# Altium footprint library 总库.PcbLib: 264 footprints (part 8 of 17)
Each footprint in its own frame and in the unit in brackets; x right, y up, seen from the top. Pads: shape width x height; smd on the part's side, far side on the other; paste and mask are expansions set on the pad; w line width, h text height; cw(c..) or ccw(c..) is an arc to the next point about the centre after c.
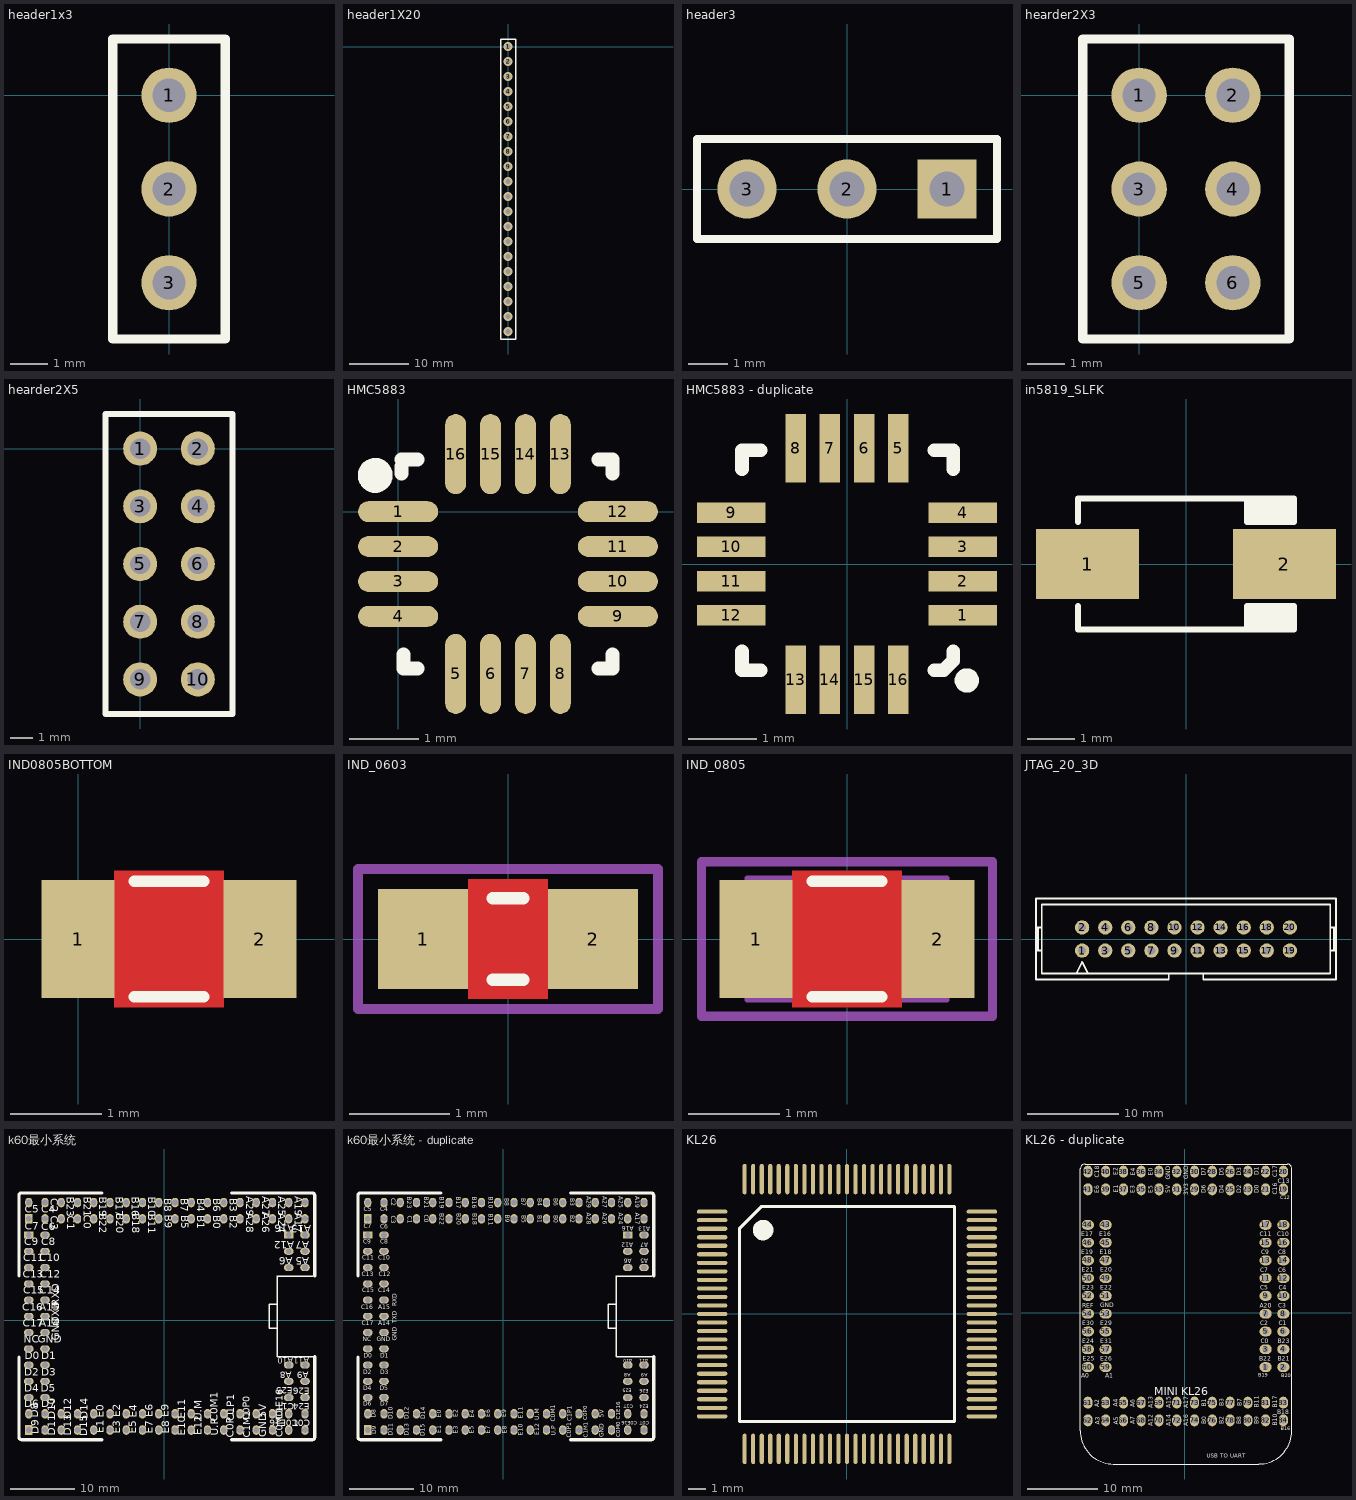
[diagram p7: the footprints below, top view; thin cyan lines are the x and y axes]

## header1x3 [mm]
pads (3):
  round 1.5 hole 0.9: 1(0,0) 2(0,-2.54) 3(0,-5.08)
Top Overlay:
  lines w0.254: -1.524,-6.604 -1.524,1.524 1.524,1.524 1.524,-6.604 -1.524,-6.604
3D body: height 8.54, standoff -3, extent -1.27,-6.35 1.22,1.27

## header1X20 [mm]
pads (20):
  round 1.5 hole 0.9: 1(0,0) 2(0,-2.54) 3(0,-5.08) 4(0,-7.62) 5(0,-10.16) 6(0,-12.7) 7(0,-15.24) 8(0,-17.78) 9(0,-20.32) 10(0,-22.86) 11(0,-25.4) 12(0,-27.94) 13(0,-30.48) 14(0,-33.02) 15(0,-35.56) 16(0,-38.1) 17(0,-40.64) 18(0,-43.18) 19(0,-45.72) 20(0,-48.26)
Top Overlay:
  lines w0.254: -1.27,-49.53 -1.27,1.27 1.27,1.27 1.27,-49.53 -1.27,-49.53
3D body: height 9.3, standoff -2.85, extent -1.27,-49.53 1.27,1.27

## header3 [mm]
pads (3):
  rect 1.5x1.5 hole 0.9: 1(2.54,0)
  round 1.5 hole 0.9: 2(0,0) 3(-2.54,0)
Top Overlay:
  lines w0.2: -3.81,-1.27 3.81,-1.27 3.81,1.27 -3.81,1.27 -3.81,-1.27

## hearder2X3 [mm]
pads (6):
  round 1.5 hole 0.9: 1(0,0) 2(2.54,0) 3(0,-2.54) 4(2.54,-2.54) 5(0,-5.08) 6(2.54,-5.08)
Top Overlay:
  lines w0.254: -1.524,-6.604 4.064,-6.604 4.064,1.524 -1.524,1.524 -1.524,-6.604
3D body: height 8.5, standoff -3, extent -1.255,-6.325 3.785,1.295

## hearder2X5 [mm]
pads (10):
  round 1.5 hole 0.9: 1(0,0) 2(2.54,0) 3(0,-2.54) 4(2.54,-2.54) 5(0,-5.08) 6(2.54,-5.08) 7(0,-7.62) 8(2.54,-7.62) 9(0,-10.16) 10(2.54,-10.16)
Top Overlay:
  lines w0.254: -1.524,-11.684 -1.524,1.524 4.064,1.524 4.064,-11.684 -1.524,-11.684

## HMC5883 [mm] "LCC, 16-Pins, Body 3.0x3.0mm (max), Pitch 0.50mm, IPC Medium Density"
height 2.54
pads (16):
  oval 1.15x0.3 smd: 1(0,0) 2(0,-0.5) 3(0,-1) 4(0,-1.5) 9(3.15,-1.5) 10(3.15,-1) 11(3.15,-0.5) 12(3.15,0)
  oval 0.3x1.15 smd: 5(0.825,-2.325) 6(1.325,-2.325) 7(1.825,-2.325) 8(2.325,-2.325) 13(2.325,0.825) 14(1.825,0.825) 15(1.325,0.825) 16(0.825,0.825)
Top Overlay:
  circle w0.25: c-0.328,0.52 r0.125
  lines w0.2: 0.051,0.547 0.051,0.647 ; 0.051,0.75 0.275,0.75 ; 0.075,-2.05 0.075,-2.25 0.275,-2.25 ; 2.875,-2.25 3.075,-2.25 3.075,-2.05 ; 2.875,0.75 3.075,0.75 3.075,0.55

## HMC5883 - duplicate [mm]
pads (16):
  rect 1x0.3 smd: 1(1.691,-0.75) 2(1.691,-0.25) 3(1.691,0.25) 4(1.691,0.75) 9(-1.691,0.75) 10(-1.691,0.25) 11(-1.691,-0.25) 12(-1.691,-0.75)
  rect 0.3x1 smd: 5(0.75,1.691) 6(0.25,1.691) 7(-0.25,1.691) 8(-0.75,1.691) 13(-0.75,-1.691) 14(-0.25,-1.691) 15(0.25,-1.691) 16(0.75,-1.691)
Top Overlay:
  circle w0.254: c1.75,-1.7 r0.05
  lines w0.2: -1.534,-1.275 -1.534,-1.55 -1.259,-1.55 ; -1.534,1.386 -1.534,1.661 -1.259,1.661 ; 1.275,-1.55 1.413,-1.55 1.55,-1.413 1.55,-1.275 ; 1.275,1.661 1.55,1.661 1.55,1.386
3D body: height 0.76, standoff 0, extent -1.526,-1.501 1.522,1.674

## in5819_SLFK [mm] "JEDEC DO214 variation AC. SMA"
height 2.5
pads (2):
  rect 2.2x1.5 smd: 1(-2.1,0) 2(2.1,0)
Top Overlay:
  rectangle: 1.3,0.9 2.3,1.4
  rectangle: 1.3,-1.4 2.3,-0.9
  lines w0.127: -2.3,-0.9 -2.3,-1.4 2.3,-1.4 2.3,-0.9 1.3,-0.9 1.3,-1.4 ; -2.3,0.9 -2.3,1.4 2.3,1.4 2.3,0.9 1.3,0.9 ; 1.3,0.911 1.3,1.4
3D body: height 2.42, standoff 0.02, extent -2.6,-1.3 2.6,1.3

## IND0805BOTTOM [mm]
pads (2):
  rect 0.8x1.3 smd: 1(0,0) 2(2,0)
Top Layer:
  pour cut-out: 0.4,0.75 1.6,0.75 1.6,-0.75 0.4,-0.75
Top Overlay:
  lines w0.127: 0.619,-0.635 1.381,-0.635 ; 0.619,0.635 1.381,0.635

## IND_0603 [mm] "Chip bead, Body 1.6x0.8mm, 0603, IPC Medium Density"
height 0.8
pads (2):
  rect 0.9x1 smd: 1(-0.85,0) 2(0.85,0)
Top Layer:
  pour cut-out: -0.4,0.6 0.4,0.6 0.4,-0.6 -0.4,-0.6
Top Overlay:
  lines w0.127: -0.152,-0.406 0.152,-0.406 ; -0.152,0.406 0.152,0.406
Mechanical 13:
  lines w0.05: -0.875,-0.475 -0.875,0.475 -0.475,0.475 -0.475,-0.475 -0.875,-0.475 ; -0.475,-0.474 0.475,-0.474 -0.475,-0.474 ; -0.475,0.474 0.475,0.474 -0.475,0.474 ; 0.475,-0.475 0.875,-0.475 0.875,0.475 0.475,0.475 0.475,-0.475
Mechanical 14:
  lines w0.1: -1.5,-0.7 1.5,-0.7 1.5,0.7 -1.5,0.7 -1.5,-0.7
3D body: height 0.79, standoff -0.01, extent -0.8,-0.4 0.8,0.4

## IND_0805 [mm] "Ferrite Bead Chip, Body 2.0x1.2mm, 0805, IPC Medium Density"
height 0.9
pads (2):
  rect 0.8x1.3 smd: 1(-1,0) 2(1,0)
Top Layer:
  pour cut-out: -0.6,0.75 0.6,0.75 0.6,-0.75 -0.6,-0.75
Top Overlay:
  lines w0.127: -0.381,-0.635 0.381,-0.635 ; -0.381,0.635 0.381,0.635
Mechanical 13:
  lines w0.05: 0.6,-0.674 -0.6,-0.674 ; -0.6,-0.675 -0.6,0.675 -1.1,0.675 -1.1,-0.675 -0.6,-0.675 ; -0.6,-0.674 0.6,-0.674 ; 0.6,-0.675 0.6,0.675 ; 0.6,-0.675 1.1,-0.675 1.1,0.675 0.6,0.675 ; 0.6,0.674 -0.6,0.674 0.6,0.674
Mechanical 14:
  lines w0.1: -1.6,-0.85 1.6,-0.85 1.6,0.85 -1.6,0.85 -1.6,-0.85
3D body: height 0.9, standoff 0, extent -1,-0.625 1,0.625

## JTAG_20_3D [mil]
pads (20):
  round 62 hole 35: 1(-450,-50) 2(-450,50) 3(-350,-50) 4(-350,50) 5(-250,-50) 6(-250,50) 7(-150,-50) 8(-150,50) 9(-50,-50) 10(-50,50) 11(50,-50) 12(50,50) 13(150,-50) 14(150,50) 15(250,-50) 16(250,50) 17(350,-50) 18(350,50) 19(450,-50) 20(450,50)
Top Overlay:
  lines w8: -650,-50 -625,-50 ; -650,50 -625,50 ; -641.67,-50 -641.67,50 ; -475,-150 -450,-100 -425,-150 ; -339.57,-175 -75,-175 -75,-150 ; -325,-175 -650,-175 -650,175 650,175 650,-175 325,-175 75,-175 75,-150 ; 625,-50 650,-50 ; 625,50 650,50 ; 641.67,-50 641.67,50 ; -75,-150 75,-150 ; -75,-150 -625,-150 -625,150 625,150 625,-150 75,-150
3D body: height 363.79, standoff -85.03, extent -643.7,-63 643.7,435.02

## k60最小系统 [mm]
pads (106):
  rect 1.5x1.1 hole 0.9: 1(-21.158,13.284) 80(19.482,13.284)
  oval 1.5x1.1 hole 0.9: 2(-18.618,13.284) 3(-21.158,10.744) 4(-18.618,10.744) 5(-21.158,8.204) 6(-18.618,8.204) 7(-21.158,5.664) 8(-18.618,5.664) 9(-21.158,3.124) 10(-18.618,3.124) 11(-21.158,0.584) 12(-18.618,0.584) 13(-21.158,-1.956) 14(-18.618,-1.956) 15(-21.158,-4.496) 16(-18.618,-4.496) 17(-21.158,-7.036) 18(-18.618,-7.036) 19(-21.158,-9.576) 20(-18.618,-9.576) 21(-21.158,-12.116) 22(-18.618,-12.116) 59(22.022,-12.116) 60(19.482,-12.116) 61(22.022,-9.576) 62(19.482,-9.576) 63(22.022,-7.036) 64(19.482,-7.036) 75(22.022,8.204) 76(19.482,8.204) 77(22.022,10.744) 78(19.482,10.744) 79(22.022,13.284)
  rect 1.1x1.5 hole 0.9: 23(-21.158,-17.196) 116(-21.158,15.824)
  oval 1.1x1.5 hole 0.9: 24(-21.158,-14.656) 25(-18.618,-17.196) 26(-18.618,-14.656) 27(-16.078,-17.196) 28(-16.078,-14.656) 29(-13.538,-17.196) 30(-13.538,-14.656) 31(-10.998,-17.196) 32(-10.998,-14.656) 33(-8.458,-17.196) 34(-8.458,-14.656) 35(-5.918,-17.196) 36(-5.918,-14.656) 37(-3.378,-17.196) 38(-3.378,-14.656) 39(-0.838,-17.196) 40(-0.838,-14.656) 41(1.702,-17.196) 42(1.702,-14.656) 43(4.242,-17.196) 44(4.242,-14.656) 45(6.782,-17.196) 46(6.782,-14.656) 47(9.322,-17.196) 48(9.322,-14.656) 49(11.862,-17.196) 50(11.862,-14.656) 51(14.402,-17.196) 52(14.402,-14.656) 53(16.942,-17.196) 54(16.942,-14.656) 55(19.482,-17.196) 56(19.482,-14.656) 57(22.022,-17.196) 58(22.022,-14.656) 81(22.022,18.364) 82(22.022,15.824) 83(19.482,18.364) 84(19.482,15.824) 85(16.942,18.364) 86(16.942,15.824) 87(14.402,18.364) 88(14.402,15.824) 89(11.862,18.364) 90(11.862,15.824) 91(9.322,18.364) 92(9.322,15.824) 93(6.782,18.364) 94(6.782,15.824) 95(4.242,18.364) 96(4.242,15.824) 97(1.702,18.364) 98(1.702,15.824) 99(-0.838,18.364) 100(-0.838,15.824) 101(-3.378,18.364) 102(-3.378,15.824) 103(-5.918,18.364) 104(-5.918,15.824) 105(-8.458,18.364) 106(-8.458,15.824) 107(-10.998,18.364) 108(-10.998,15.824) 109(-13.538,18.364) 110(-13.538,15.824) 111(-16.078,18.364) 112(-16.078,15.824) 113(-18.618,18.364) 114(-18.618,15.824) 115(-21.158,18.364)
Top Overlay:
  lines w0.203: 17.704,-5.766 17.704,6.934 ; 17.704,-5.715 23.216,-5.715 ; 17.704,-1.295 16.416,-1.295 16.416,2.438 17.704,2.438 ; 17.704,6.858 23.216,6.858
  lines w0.508: -22.682,-5.766 -22.682,-18.313 ccw(c-22.301,-18.313) -22.301,-18.694 -9.728,-18.694 ; -22.682,6.934 -22.682,19.482 cw(c-22.301,19.482) -22.301,19.863 -9.728,19.863 ; 10.592,-18.694 23.165,-18.694 ccw(c23.165,-18.313) 23.546,-18.313 23.546,-5.715 ; 10.592,19.863 23.165,19.863 cw(c23.165,19.482) 23.546,19.482 23.546,6.934
  text "C3" at -17.704,16.332 h1.2
  text "C2" at -17.704,19.05 h1.2
  text "C1" at -15.113,16.332 h1.2
  text "B23" at -15.189,19.253 h1.2
  text "C0" at -12.573,16.459 h1.2
  text "B21" at -12.598,19.279 h1.2
  text "B19" at -10.109,19.279 h1.2
  text "B22" at -10.109,16.662 h1.2
  text "B20" at -7.518,16.662 h1.2
  text "B17" at -7.544,19.279 h1.2
  text "B18" at -5.004,16.662 h1.2
  text "B16" at -5.029,19.279 h1.2
  text "B11" at -2.464,16.637 h1.2
  text "B10" at -2.464,19.253 h1.2
  text "B9" at 0.076,16.434 h1.2
  text "B8" at 0.025,19.025 h1.2
  text "B5" at 2.642,16.358 h1.2
  text "B7" at 2.616,19.05 h1.2
  text "B4" at 5.156,19.025 h1.2
  text "B1" at 5.207,16.358 h1.2
  text "B0" at 7.696,16.383 h1.2
  text "B6" at 7.696,18.999 h1.2
  text "B2" at 10.262,16.408 h1.2
  text "B3" at 10.287,19.05 h1.2
  text "A28" at 12.827,16.739 h1.2
  text "A29" at 12.802,19.329 h1.2
  text "A26" at 15.367,16.764 h1.2
  text "A27" at 15.342,19.38 h1.2
  text "A24" at 17.882,16.789 h1.2
  text "A25" at 17.856,19.355 h1.2
  text "A17" at 20.447,16.789 h1.2
  text "A19" at 20.396,19.38 h1.2
  text "A16" at 20.422,14.859 h1.2
  text "A13" at 23.012,14.834 h1.2
  text "A12" at 20.371,12.344 h1.2
  text "A7" at 22.682,12.319 h1.2
  text "A6" at 20.117,9.804 h1.2
  text "A5" at 22.657,9.804 h1.2
  text "A10" at 20.168,-5.867 h0.9
  text "A11" at 22.708,-5.867 h0.9
  text "A8" at 19.964,-8.052 h1
  text "A9" at 22.631,-8.052 h1
  text "E25" at 20.117,-10.541 h1
  text "E26" at 22.758,-10.592 h1
  text "E24" at 22.784,-13.005 h1
  text "C1T" at 20.32,-13.005 h1
  text "C0T" at 22.86,-15.621 h1
  text "C0E16" at 20.955,-15.596 h1
  text "C1E16" at 18.567,-15.596 h1.1
  text "C0M0" at 18.567,-18.339 h1.1
  text "5V" at 15.977,-15.265 h1.2
  text "GND" at 15.951,-18.339 h1.2
  text "C0P0" at 13.386,-15.672 h1.1
  text "C1M1" at 13.437,-18.39 h1.1
  text "C1P1" at 10.973,-15.85 h1.2
  text "C0P1" at 10.922,-18.415 h1.2
  text "C0M1" at 8.407,-15.875 h1.2
  text "U.P" at 8.433,-18.059 h1.2
  text "U.M" at 5.867,-15.672 h1.2
  text "E12" at 5.918,-18.034 h1.2
  text "E11" at 3.302,-15.443 h1.2
  text "E10" at 3.302,-18.059 h1.2
  text "E9" at 0.762,-15.164 h1.2
  text "E8" at 0.787,-17.78 h1.2
  text "E7" at -1.753,-17.805 h1.2
  text "E6" at -1.803,-15.189 h1.2
  text "E4" at -4.293,-15.24 h1.2
  text "E5" at -4.318,-17.805 h1.2
  text "E2" at -6.858,-15.189 h1.2
  text "E3" at -6.833,-17.755 h1.2
  text "E0" at -9.398,-15.24 h1.2
  text "E1" at -9.423,-17.729 h1.2
  text "D14" at -11.938,-15.519 h1.2
  text "D15" at -11.989,-18.136 h1.2
  text "D12" at -14.478,-15.519 h1.2
  text "D13" at -14.503,-18.11 h1.2
  text "D10" at -17.018,-15.545 h1.2
  text "D11" at -17.043,-18.085 h1.2
  text "D8" at -19.634,-15.265 h1.2
  text "D9" at -19.583,-17.831 h1.2
  text "D7" at -19.228,-13.614 h1.2
  text "D6" at -21.844,-13.614 h1.2
  text "D5" at -19.253,-11.201 h1.2
  text "D4" at -21.844,-11.201 h1.2
  text "D3" at -19.202,-8.687 h1.2
  text "D2" at -21.844,-8.687 h1.2
  text "D1" at -19.177,-6.121 h1.2
  text "D0" at -21.819,-6.096 h1.2
  text "GND" at -19.736,-3.556 h1.2
  text "NC" at -21.92,-3.581 h1.2
  text "A14" at -19.533,-1.067 h1.2
  text "C17" at -22.098,-1.041 h1.2
  text "A15" at -19.533,1.473 h1.2
  text "C16" at -22.149,1.473 h1.2
  text "C14" at -19.507,4.115 h1.2
  text "C15" at -22.022,4.089 h1.2
  text "C12" at -19.431,6.579 h1.2
  text "C13" at -22.073,6.604 h1.2
  text "C10" at -19.482,9.169 h1.2
  text "C11" at -22.022,9.195 h1.2
  text "C8" at -19.228,11.659 h1.2
  text "C9" at -21.869,11.659 h1.2
  text "C6" at -19.228,14.072 h1.2
  text "C7" at -21.793,14.122 h1.2
  text "C4" at -19.202,16.739 h1.2
  text "C5" at -21.768,16.764 h1.2
  text "GND" at -16.367,-3.2 h1.2
  text "TXD" at -16.383,-0.508 h1.2
  text "RXD" at -16.383,2.184 h1.2
Bottom Overlay:
  lines w0.2: -22.428,-13.386 -22.428,-18.466 23.292,-18.466 23.292,-13.386 ; -22.428,-13.386 23.292,-13.386 ; -22.428,-13.386 -22.428,14.554 ; -22.428,-13.386 -17.348,-13.386 -17.348,14.554 -22.428,14.554 ; -22.428,14.554 -22.428,19.634 23.292,19.634 23.292,14.554 ; -22.428,14.554 23.292,14.554 ; 23.292,-13.386 23.292,14.554 ; 23.292,-13.386 18.212,-13.386 18.212,14.554 23.292,14.554
  lines w0.203: 23.216,-3.175 23.216,4.318
3D body: height 10.62, standoff -0.92, extent -22.378,-18.466 -19.888,-13.386
3D body: height 10.62, standoff -0.92, extent -19.838,-18.466 -17.348,-13.386
3D body: height 10.62, standoff -0.92, extent -17.298,-18.466 -14.808,-13.386
3D body: height 10.62, standoff -0.92, extent -14.758,-18.466 -12.268,-13.386
3D body: height 10.62, standoff -0.92, extent -12.218,-18.466 -9.728,-13.386
3D body: height 10.62, standoff -0.92, extent -9.678,-18.466 -7.188,-13.386
3D body: height 10.62, standoff -0.92, extent 5.562,-18.466 8.052,-13.386
3D body: height 10.62, standoff -0.92, extent 3.022,-18.466 5.512,-13.386
3D body: height 10.62, standoff -0.92, extent 0.482,-18.466 2.972,-13.386
3D body: height 10.62, standoff -0.92, extent -2.058,-18.466 0.432,-13.386
3D body: height 10.62, standoff -0.92, extent -4.598,-18.466 -2.108,-13.386
3D body: height 10.62, standoff -0.92, extent -7.138,-18.466 -4.648,-13.386
3D body: height 10.62, standoff -0.92, extent 20.802,-18.466 23.292,-13.386
3D body: height 10.62, standoff -0.92, extent 18.262,-18.466 20.752,-13.386
3D body: height 10.62, standoff -0.92, extent 15.722,-18.466 18.212,-13.386
3D body: height 10.62, standoff -0.92, extent 13.182,-18.466 15.672,-13.386
3D body: height 10.62, standoff -0.92, extent 10.642,-18.466 13.132,-13.386
3D body: height 10.62, standoff -0.92, extent 8.102,-18.466 10.592,-13.386
3D body: height 10.62, standoff -0.92, extent 18.212,12.014 23.292,14.504
3D body: height 10.62, standoff -0.92, extent 18.212,9.474 23.292,11.964
3D body: height 10.62, standoff -0.92, extent 18.212,6.934 23.292,9.424
3D body: height 10.62, standoff -0.92, extent 18.212,-13.386 23.292,-10.896
3D body: height 10.62, standoff -0.92, extent 18.212,-10.846 23.292,-8.356
3D body: height 10.62, standoff -0.92, extent 18.212,-8.306 23.292,-5.816
3D body: height 16.16, standoff 4.62, extent 18.212,-5.766 23.292,-3.276
3D body: height 16.16, standoff 4.62, extent 18.212,-3.226 23.292,-0.736
3D body: height 16.16, standoff 4.62, extent 18.212,-0.686 23.292,1.804
3D body: height 16.16, standoff 4.62, extent 18.212,1.854 23.292,4.344
3D body: height 16.16, standoff 4.62, extent 18.212,4.394 23.292,6.884
3D body: height 10.62, standoff -0.92, extent -22.428,-5.766 -17.348,-3.276
3D body: height 10.62, standoff -0.92, extent -22.428,-8.306 -17.348,-5.816
3D body: height 10.62, standoff -0.92, extent -22.428,-10.846 -17.348,-8.356
3D body: height 10.62, standoff -0.92, extent -22.428,-13.386 -17.348,-10.896
3D body: height 10.62, standoff -0.92, extent -22.428,12.014 -17.348,14.504
3D body: height 10.62, standoff -0.92, extent -22.428,9.474 -17.348,11.964
3D body: height 10.62, standoff -0.92, extent -22.428,6.934 -17.348,9.424
3D body: height 10.62, standoff -0.92, extent -22.428,4.394 -17.348,6.884
3D body: height 10.62, standoff -0.92, extent -22.428,-3.226 -19.938,4.394
3D body: height 16.16, standoff 4.62, extent -19.888,-3.226 -17.398,4.394
3D body: height 10.62, standoff -0.92, extent -22.378,14.554 -19.888,19.634
3D body: height 10.62, standoff -0.92, extent -19.838,14.554 -17.348,19.634
3D body: height 10.62, standoff -0.92, extent -17.298,14.554 -14.808,19.634
3D body: height 10.62, standoff -0.92, extent -14.758,14.554 -12.268,19.634
3D body: height 10.62, standoff -0.92, extent -12.218,14.554 -9.728,19.634
3D body: height 10.62, standoff -0.92, extent -9.678,14.554 -7.188,19.634
3D body: height 10.62, standoff -0.92, extent 5.562,14.554 8.052,19.634
3D body: height 10.62, standoff -0.92, extent 3.022,14.554 5.512,19.634
3D body: height 10.62, standoff -0.92, extent 0.482,14.554 2.972,19.634
3D body: height 10.62, standoff -0.92, extent -2.058,14.554 0.432,19.634
3D body: height 10.62, standoff -0.92, extent -4.598,14.554 -2.108,19.634
3D body: height 10.62, standoff -0.92, extent -7.138,14.554 -4.648,19.634
3D body: height 10.62, standoff -0.92, extent 20.802,14.554 23.292,19.634
3D body: height 10.62, standoff -0.92, extent 18.262,14.554 20.752,19.634
3D body: height 10.62, standoff -0.92, extent 15.722,14.554 18.212,19.634
3D body: height 10.62, standoff -0.92, extent 13.182,14.554 15.672,19.634
3D body: height 10.62, standoff -0.92, extent 10.642,14.554 13.132,19.634
3D body: height 10.62, standoff -0.92, extent 8.102,14.554 10.592,19.634

## k60最小系统 - duplicate [mm]
pads (106):
  rect 1.5x1.1 hole 0.9: 1(-21.158,13.284) 80(19.482,13.284)
  oval 1.5x1.1 hole 0.9: 2(-18.618,13.284) 3(-21.158,10.744) 4(-18.618,10.744) 5(-21.158,8.204) 6(-18.618,8.204) 7(-21.158,5.664) 8(-18.618,5.664) 9(-21.158,3.124) 10(-18.618,3.124) 11(-21.158,0.584) 12(-18.618,0.584) 13(-21.158,-1.956) 14(-18.618,-1.956) 15(-21.158,-4.496) 16(-18.618,-4.496) 17(-21.158,-7.036) 18(-18.618,-7.036) 19(-21.158,-9.576) 20(-18.618,-9.576) 21(-21.158,-12.116) 22(-18.618,-12.116) 59(22.022,-12.116) 60(19.482,-12.116) 61(22.022,-9.576) 62(19.482,-9.576) 63(22.022,-7.036) 64(19.482,-7.036) 75(22.022,8.204) 76(19.482,8.204) 77(22.022,10.744) 78(19.482,10.744) 79(22.022,13.284)
  rect 1.1x1.5 hole 0.9: 23(-21.158,-17.196) 116(-21.158,15.824)
  oval 1.1x1.5 hole 0.9: 24(-21.158,-14.656) 25(-18.618,-17.196) 26(-18.618,-14.656) 27(-16.078,-17.196) 28(-16.078,-14.656) 29(-13.538,-17.196) 30(-13.538,-14.656) 31(-10.998,-17.196) 32(-10.998,-14.656) 33(-8.458,-17.196) 34(-8.458,-14.656) 35(-5.918,-17.196) 36(-5.918,-14.656) 37(-3.378,-17.196) 38(-3.378,-14.656) 39(-0.838,-17.196) 40(-0.838,-14.656) 41(1.702,-17.196) 42(1.702,-14.656) 43(4.242,-17.196) 44(4.242,-14.656) 45(6.782,-17.196) 46(6.782,-14.656) 47(9.322,-17.196) 48(9.322,-14.656) 49(11.862,-17.196) 50(11.862,-14.656) 51(14.402,-17.196) 52(14.402,-14.656) 53(16.942,-17.196) 54(16.942,-14.656) 55(19.482,-17.196) 56(19.482,-14.656) 57(22.022,-17.196) 58(22.022,-14.656) 81(22.022,18.364) 82(22.022,15.824) 83(19.482,18.364) 84(19.482,15.824) 85(16.942,18.364) 86(16.942,15.824) 87(14.402,18.364) 88(14.402,15.824) 89(11.862,18.364) 90(11.862,15.824) 91(9.322,18.364) 92(9.322,15.824) 93(6.782,18.364) 94(6.782,15.824) 95(4.242,18.364) 96(4.242,15.824) 97(1.702,18.364) 98(1.702,15.824) 99(-0.838,18.364) 100(-0.838,15.824) 101(-3.378,18.364) 102(-3.378,15.824) 103(-5.918,18.364) 104(-5.918,15.824) 105(-8.458,18.364) 106(-8.458,15.824) 107(-10.998,18.364) 108(-10.998,15.824) 109(-13.538,18.364) 110(-13.538,15.824) 111(-16.078,18.364) 112(-16.078,15.824) 113(-18.618,18.364) 114(-18.618,15.824) 115(-21.158,18.364)
Top Overlay:
  lines w0.203: 17.704,-5.766 17.704,6.934 ; 17.704,-5.715 23.216,-5.715 ; 17.704,-1.295 16.416,-1.295 16.416,2.438 17.704,2.438 ; 17.704,6.858 23.216,6.858
  lines w0.508: -22.682,-5.766 -22.682,-18.313 ccw(c-22.301,-18.313) -22.301,-18.694 -9.728,-18.694 ; -22.682,6.934 -22.682,19.482 cw(c-22.301,19.482) -22.301,19.863 -9.728,19.863 ; 10.592,-18.694 23.165,-18.694 ccw(c23.165,-18.313) 23.546,-18.313 23.546,-5.715 ; 10.592,19.863 23.165,19.863 cw(c23.165,19.482) 23.546,19.482 23.546,6.934
  text "C3" at -17.704,16.332 h1.2
  text "C2" at -17.704,19.05 h1.2
  text "C1" at -15.113,16.332 h1.2
  text "B23" at -15.189,19.253 h1.2
  text "C0" at -12.573,16.459 h1.2
  text "B21" at -12.598,19.279 h1.2
  text "B19" at -10.109,19.279 h1.2
  text "B22" at -10.109,16.662 h1.2
  text "B20" at -7.518,16.662 h1.2
  text "B17" at -7.544,19.279 h1.2
  text "B18" at -5.004,16.662 h1.2
  text "B16" at -5.029,19.279 h1.2
  text "B11" at -2.464,16.637 h1.2
  text "B10" at -2.464,19.253 h1.2
  text "B9" at 0.076,16.434 h1.2
  text "B8" at 0.025,19.025 h1.2
  text "B5" at 2.642,16.358 h1.2
  text "B7" at 2.616,19.05 h1.2
  text "B4" at 5.156,19.025 h1.2
  text "B1" at 5.207,16.358 h1.2
  text "B0" at 7.696,16.383 h1.2
  text "B6" at 7.696,18.999 h1.2
  text "B2" at 10.262,16.408 h1.2
  text "B3" at 10.287,19.05 h1.2
  text "A28" at 12.827,16.739 h1.2
  text "A29" at 12.802,19.329 h1.2
  text "A26" at 15.367,16.764 h1.2
  text "A27" at 15.342,19.38 h1.2
  text "A24" at 17.882,16.789 h1.2
  text "A25" at 17.856,19.355 h1.2
  text "A17" at 20.447,16.789 h1.2
  text "A19" at 20.396,19.38 h1.2
  text "A16" at 20.422,14.859 h1.2
  text "A13" at 23.012,14.834 h1.2
  text "A12" at 20.371,12.344 h1.2
  text "A7" at 22.682,12.319 h1.2
  text "A6" at 20.117,9.804 h1.2
  text "A5" at 22.657,9.804 h1.2
  text "A10" at 20.168,-5.867 h0.9
  text "A11" at 22.708,-5.867 h0.9
  text "A8" at 19.964,-8.052 h1
  text "A9" at 22.631,-8.052 h1
  text "E25" at 20.117,-10.541 h1
  text "E26" at 22.758,-10.592 h1
  text "E24" at 22.784,-13.005 h1
  text "C1T" at 20.32,-13.005 h1
  text "C0T" at 22.86,-15.621 h1
  text "C0E16" at 20.955,-15.596 h1
  text "C1E16" at 18.567,-15.596 h1.1
  text "C0M0" at 18.567,-18.339 h1.1
  text "5V" at 15.977,-15.265 h1.2
  text "GND" at 15.951,-18.339 h1.2
  text "C0P0" at 13.386,-15.672 h1.1
  text "C1M1" at 13.437,-18.39 h1.1
  text "C1P1" at 10.973,-15.85 h1.2
  text "C0P1" at 10.922,-18.415 h1.2
  text "C0M1" at 8.407,-15.875 h1.2
  text "U.P" at 8.433,-18.059 h1.2
  text "U.M" at 5.867,-15.672 h1.2
  text "E12" at 5.918,-18.034 h1.2
  text "E11" at 3.302,-15.443 h1.2
  text "E10" at 3.302,-18.059 h1.2
  text "E9" at 0.762,-15.164 h1.2
  text "E8" at 0.787,-17.78 h1.2
  text "E7" at -1.753,-17.805 h1.2
  text "E6" at -1.803,-15.189 h1.2
  text "E4" at -4.293,-15.24 h1.2
  text "E5" at -4.318,-17.805 h1.2
  text "E2" at -6.858,-15.189 h1.2
  text "E3" at -6.833,-17.755 h1.2
  text "E0" at -9.398,-15.24 h1.2
  text "E1" at -9.423,-17.729 h1.2
  text "D14" at -11.938,-15.519 h1.2
  text "D15" at -11.989,-18.136 h1.2
  text "D12" at -14.478,-15.519 h1.2
  text "D13" at -14.503,-18.11 h1.2
  text "D10" at -17.018,-15.545 h1.2
  text "D11" at -17.043,-18.085 h1.2
  text "D8" at -19.634,-15.265 h1.2
  text "D9" at -19.583,-17.831 h1.2
  text "D7" at -19.228,-13.614 h1.2
  text "D6" at -21.844,-13.614 h1.2
  text "D5" at -19.253,-11.201 h1.2
  text "D4" at -21.844,-11.201 h1.2
  text "D3" at -19.202,-8.687 h1.2
  text "D2" at -21.844,-8.687 h1.2
  text "D1" at -19.177,-6.121 h1.2
  text "D0" at -21.819,-6.096 h1.2
  text "GND" at -19.736,-3.556 h1.2
  text "NC" at -21.92,-3.581 h1.2
  text "A14" at -19.533,-1.067 h1.2
  text "C17" at -22.098,-1.041 h1.2
  text "A15" at -19.533,1.473 h1.2
  text "C16" at -22.149,1.473 h1.2
  text "C14" at -19.507,4.115 h1.2
  text "C15" at -22.022,4.089 h1.2
  text "C12" at -19.431,6.579 h1.2
  text "C13" at -22.073,6.604 h1.2
  text "C10" at -19.482,9.169 h1.2
  text "C11" at -22.022,9.195 h1.2
  text "C8" at -19.228,11.659 h1.2
  text "C9" at -21.869,11.659 h1.2
  text "C6" at -19.228,14.072 h1.2
  text "C7" at -21.793,14.122 h1.2
  text "C4" at -19.202,16.739 h1.2
  text "C5" at -21.768,16.764 h1.2
  text "GND" at -16.367,-3.2 h1.2
  text "TXD" at -16.383,-0.508 h1.2
  text "RXD" at -16.383,2.184 h1.2
Bottom Overlay:
  lines w0.2: -22.428,-13.386 -22.428,-18.466 23.292,-18.466 23.292,-13.386 ; -22.428,-13.386 23.292,-13.386 ; -22.428,-13.386 -22.428,14.554 ; -22.428,-13.386 -17.348,-13.386 -17.348,14.554 -22.428,14.554 ; -22.428,14.554 -22.428,19.634 23.292,19.634 23.292,14.554 ; -22.428,14.554 23.292,14.554 ; 23.292,-13.386 23.292,14.554 ; 23.292,-13.386 18.212,-13.386 18.212,14.554 23.292,14.554
  lines w0.203: 23.216,-3.175 23.216,4.318
3D body: height 10.62, standoff -0.92, extent -22.378,-18.466 -19.888,-13.386
3D body: height 10.62, standoff -0.92, extent -19.838,-18.466 -17.348,-13.386
3D body: height 10.62, standoff -0.92, extent -17.298,-18.466 -14.808,-13.386
3D body: height 10.62, standoff -0.92, extent -14.758,-18.466 -12.268,-13.386
3D body: height 10.62, standoff -0.92, extent -12.218,-18.466 -9.728,-13.386
3D body: height 10.62, standoff -0.92, extent -9.678,-18.466 -7.188,-13.386
3D body: height 10.62, standoff -0.92, extent 5.562,-18.466 8.052,-13.386
3D body: height 10.62, standoff -0.92, extent 3.022,-18.466 5.512,-13.386
3D body: height 10.62, standoff -0.92, extent 0.482,-18.466 2.972,-13.386
3D body: height 10.62, standoff -0.92, extent -2.058,-18.466 0.432,-13.386
3D body: height 10.62, standoff -0.92, extent -4.598,-18.466 -2.108,-13.386
3D body: height 10.62, standoff -0.92, extent -7.138,-18.466 -4.648,-13.386
3D body: height 10.62, standoff -0.92, extent 20.802,-18.466 23.292,-13.386
3D body: height 10.62, standoff -0.92, extent 18.262,-18.466 20.752,-13.386
3D body: height 10.62, standoff -0.92, extent 15.722,-18.466 18.212,-13.386
3D body: height 10.62, standoff -0.92, extent 13.182,-18.466 15.672,-13.386
3D body: height 10.62, standoff -0.92, extent 10.642,-18.466 13.132,-13.386
3D body: height 10.62, standoff -0.92, extent 8.102,-18.466 10.592,-13.386
3D body: height 10.62, standoff -0.92, extent 18.212,12.014 23.292,14.504
3D body: height 10.62, standoff -0.92, extent 18.212,9.474 23.292,11.964
3D body: height 10.62, standoff -0.92, extent 18.212,6.934 23.292,9.424
3D body: height 10.62, standoff -0.92, extent 18.212,-13.386 23.292,-10.896
3D body: height 10.62, standoff -0.92, extent 18.212,-10.846 23.292,-8.356
3D body: height 10.62, standoff -0.92, extent 18.212,-8.306 23.292,-5.816
3D body: height 16.16, standoff 4.62, extent 18.212,-5.766 23.292,-3.276
3D body: height 16.16, standoff 4.62, extent 18.212,-3.226 23.292,-0.736
3D body: height 16.16, standoff 4.62, extent 18.212,-0.686 23.292,1.804
3D body: height 16.16, standoff 4.62, extent 18.212,1.854 23.292,4.344
3D body: height 16.16, standoff 4.62, extent 18.212,4.394 23.292,6.884
3D body: height 10.62, standoff -0.92, extent -22.428,-5.766 -17.348,-3.276
3D body: height 10.62, standoff -0.92, extent -22.428,-8.306 -17.348,-5.816
3D body: height 10.62, standoff -0.92, extent -22.428,-10.846 -17.348,-8.356
3D body: height 10.62, standoff -0.92, extent -22.428,-13.386 -17.348,-10.896
3D body: height 10.62, standoff -0.92, extent -22.428,12.014 -17.348,14.504
3D body: height 10.62, standoff -0.92, extent -22.428,9.474 -17.348,11.964
3D body: height 10.62, standoff -0.92, extent -22.428,6.934 -17.348,9.424
3D body: height 10.62, standoff -0.92, extent -22.428,4.394 -17.348,6.884
3D body: height 10.62, standoff -0.92, extent -22.428,-3.226 -19.938,4.394
3D body: height 16.16, standoff 4.62, extent -19.888,-3.226 -17.398,4.394
3D body: height 10.62, standoff -0.92, extent -22.378,14.554 -19.888,19.634
3D body: height 10.62, standoff -0.92, extent -19.838,14.554 -17.348,19.634
3D body: height 10.62, standoff -0.92, extent -17.298,14.554 -14.808,19.634
3D body: height 10.62, standoff -0.92, extent -14.758,14.554 -12.268,19.634
3D body: height 10.62, standoff -0.92, extent -12.218,14.554 -9.728,19.634
3D body: height 10.62, standoff -0.92, extent -9.678,14.554 -7.188,19.634
3D body: height 10.62, standoff -0.92, extent 5.562,14.554 8.052,19.634
3D body: height 10.62, standoff -0.92, extent 3.022,14.554 5.512,19.634
3D body: height 10.62, standoff -0.92, extent 0.482,14.554 2.972,19.634
3D body: height 10.62, standoff -0.92, extent -2.058,14.554 0.432,19.634
3D body: height 10.62, standoff -0.92, extent -4.598,14.554 -2.108,19.634
3D body: height 10.62, standoff -0.92, extent -7.138,14.554 -4.648,19.634
3D body: height 10.62, standoff -0.92, extent 20.802,14.554 23.292,19.634
3D body: height 10.62, standoff -0.92, extent 18.262,14.554 20.752,19.634
3D body: height 10.62, standoff -0.92, extent 15.722,14.554 18.212,19.634
3D body: height 10.62, standoff -0.92, extent 13.182,14.554 15.672,19.634
3D body: height 10.62, standoff -0.92, extent 10.642,14.554 13.132,19.634
3D body: height 10.62, standoff -0.92, extent 8.102,14.554 10.592,19.634

## KL26 [mil] "TSQFP, 100-Leads, Body 16.2x16.2mm (max), Pitch 0.50mm, IPC Medium Density"
height 62.99
pads (100):
  oval 70x9.5 smd: 1(-311.23,236.22) 2(-311.23,216.54) 3(-311.23,196.85) 4(-311.23,177.17) 5(-311.23,157.48) 6(-311.23,137.8) 7(-311.23,118.11) 8(-311.23,98.43) 9(-311.23,78.74) 10(-311.23,59.06) 11(-311.23,39.37) 12(-311.23,19.68) 13(-311.23,0) 14(-311.23,-19.69) 15(-311.23,-39.37) 16(-311.23,-59.06) 17(-311.23,-78.74) 18(-311.23,-98.43) 19(-311.23,-118.11) 20(-311.23,-137.8) 21(-311.23,-157.48) 22(-311.23,-177.17) 23(-311.23,-196.85) 24(-311.23,-216.54) 25(-311.23,-236.22) 51(311.23,-236.22) 52(311.23,-216.54) 53(311.23,-196.85) 54(311.23,-177.17) 55(311.23,-157.48) 56(311.23,-137.8) 57(311.23,-118.11) 58(311.23,-98.43) 59(311.23,-78.74) 60(311.23,-59.06) 61(311.23,-39.37) 62(311.23,-19.69) 63(311.23,0) 64(311.23,19.68) 65(311.23,39.37) 66(311.23,59.06) 67(311.23,78.74) 68(311.23,98.43) 69(311.23,118.11) 70(311.23,137.8) 71(311.23,157.48) 72(311.23,177.17) 73(311.23,196.85) 74(311.23,216.54) 75(311.23,236.22)
  oval 9.5x70 smd: 26(-236.22,-311.23) 27(-216.54,-311.23) 28(-196.85,-311.23) 29(-177.17,-311.23) 30(-157.48,-311.23) 31(-137.8,-311.23) 32(-118.11,-311.23) 33(-98.43,-311.23) 34(-78.74,-311.23) 35(-59.06,-311.23) 36(-39.37,-311.23) 37(-19.68,-311.23) 38(0,-311.23) 39(19.69,-311.23) 40(39.37,-311.23) 41(59.06,-311.23) 42(78.74,-311.23) 43(98.43,-311.23) 44(118.11,-311.23) 45(137.8,-311.23) 46(157.48,-311.23) 47(177.17,-311.23) 48(196.85,-311.23) 49(216.54,-311.23) 50(236.22,-311.23) 76(236.22,311.23) 77(216.54,311.23) 78(196.85,311.23) 79(177.17,311.23) 80(157.48,311.23) 81(137.8,311.23) 82(118.11,311.23) 83(98.43,311.23) 84(78.74,311.23) 85(59.06,311.23) 86(39.37,311.23) 87(19.69,311.23) 88(0,311.23) 89(-19.68,311.23) 90(-39.37,311.23) 91(-59.06,311.23) 92(-78.74,311.23) 93(-98.43,311.23) 94(-118.11,311.23) 95(-137.8,311.23) 96(-157.48,311.23) 97(-177.17,311.23) 98(-196.85,311.23) 99(-216.54,311.23) 100(-236.22,311.23)
Top Overlay:
  circle w23.62: c-193.66,193.66 r11.81
  lines w7.87: -248.03,-248.03 -248.03,197.97 -197.97,248.03 248.03,248.03 248.03,-248.03 -248.03,-248.03
3D body: height 47.24, standoff 0, extent -314.96,-314.96 314.96,314.96

## KL26 - duplicate [mm]
pads (84):
  oval 1.75x1.397 hole 0.9: 1(11.557,-7.747) 2(14.097,-7.747) 3(11.557,-5.207) 4(14.097,-5.207) 5(11.557,-2.667) 6(14.097,-2.667) 7(11.557,-0.127) 8(14.097,-0.127) 9(11.557,2.413) 10(14.097,2.413) 11(11.557,4.953) 12(14.097,4.953) 13(11.557,7.493) 14(14.097,7.493) 15(11.557,10.033) 16(14.097,10.033) 17(11.557,12.573) 18(14.097,12.573) 43(-11.303,12.573) 44(-13.843,12.573) 45(-11.303,10.033) 46(-13.843,10.033) 47(-11.303,7.493) 48(-13.843,7.493) 49(-11.303,4.953) 50(-13.843,4.953) 51(-11.303,2.413) 52(-13.843,2.413) 53(-11.303,-0.127) 54(-13.843,-0.127) 55(-11.303,-2.667) 56(-13.843,-2.667) 57(-11.303,-5.207) 58(-13.843,-5.207) 59(-11.303,-7.747) 60(-13.843,-7.747)
  oval 1.3x1.7 hole 0.9: 19(14.097,17.653) 20(14.097,20.193) 21(11.557,17.653) 22(11.557,20.193) 23(9.017,17.653) 24(9.017,20.193) 25(6.477,17.653) 26(6.477,20.193) 27(3.937,17.653) 28(3.937,20.193) 29(1.397,17.653) 30(1.397,20.193) 31(-1.143,17.653) 32(-1.143,20.193) 33(-3.683,17.653) 34(-3.683,20.193) 35(-6.223,17.653) 36(-6.223,20.193) 37(-8.763,17.653) 38(-8.763,20.193) 39(-11.303,17.653) 40(-11.303,20.193) 41(-13.843,17.653) 42(-13.843,20.193) 61(-13.843,-12.827) 62(-13.843,-15.367) 63(-11.303,-12.827) 64(-11.303,-15.367) 65(-8.763,-12.827) 66(-8.763,-15.367) 67(-6.223,-12.827) 68(-6.223,-15.367) 69(-3.683,-12.827) 70(-3.683,-15.367) 71(-1.143,-12.827) 72(-1.143,-15.367) 73(1.397,-12.827) 74(1.397,-15.367) 75(3.937,-12.827) 76(3.937,-15.367) 77(6.477,-12.827) 78(6.477,-15.367) 79(9.017,-12.827) 80(9.017,-15.367) 81(11.557,-12.827) 82(11.557,-15.367) 83(14.097,-12.827) 84(14.097,-15.367)
Top Overlay:
  lines w0.1: -14.928,-16.875 ccw(c-10.196,-16.875) -10.196,-21.608 10.609,-21.608 ccw(c10.609,-16.926) 15.291,-16.926 15.291,20.672 ccw(c14.687,20.672) 14.687,21.275 -14.25,21.275 ccw(c-14.25,20.597) -14.928,20.597 -14.928,-16.875
  text "USB TO UART" at 3.175,-20.955 h1
  text "B22" at 10.669,-6.884 h0.64
  text "B21" at 13.305,-6.861 h0.64
  text "B23" at 13.27,-4.35 h0.64
  text "C0" at 10.855,-4.316 h0.64
  text "C2" at 10.811,-1.759 h0.64
  text "C1" at 13.458,-1.783 h0.64
  text "C3" at 13.365,0.746 h0.64
  text "A20" at 10.696,0.717 h0.64
  text "C5" at 10.785,3.272 h0.64
  text "C4" at 13.442,3.272 h0.64
  text "C6" at 13.356,5.82 h0.64
  text "C7" at 10.793,5.826 h0.64
  text "C9" at 10.903,8.382 h0.64
  text "C8" at 13.399,8.394 h0.64
  text "C10" at 13.233,10.926 h0.64
  text "C11" at 10.699,10.915 h0.64
  text "B19" at 10.49,-9.123 h0.5
  text "B20" at 13.769,-9.178 h0.5
  text "E6" at -12.221,17.065 h0.64
  text "C18" at -12.194,19.299 h0.64
  text "E2" at -9.555,19.641 h0.64
  text "E1" at -9.537,17.164 h0.64
  text "E3" at -7.141,17.065 h0.64
  text "E4" at -7.082,19.609 h0.64
  text "E0" at -4.601,19.605 h0.64
  text "E5" at -4.601,17.065 h0.64
  text "GND" at -2.05,19.05 h0.64
  text "5V" at -2.052,17.075 h0.64
  text "3V3" at 0.52,16.842 h0.64
  text "GND" at 0.482,19.069 h0.64
  text "D7" at 3.019,19.605 h0.64
  text "D6" at 3.019,17.065 h0.64
  text "D5" at 5.559,19.605 h0.64
  text "D4" at 5.559,17.065 h0.64
  text "D3" at 8.099,19.605 h0.64
  text "D2" at 8.099,17.065 h0.64
  text "D0" at 10.592,17.083 h0.64
  text "D1" at 10.593,19.643 h0.64
  text "C17" at 13.226,19.354 h0.64
  text "C16" at 13.207,16.852 h0.64
  text "C13" at 13.293,18.554 h0.64
  text "C12" at 13.688,16.247 h0.5
  text "MINI KL26" at -4.336,-11.771 h1.15
  text "E25" at -14.603,-6.876 h0.64
  text "E26" at -12.071,-6.848 h0.64
  text "E31" at -12.102,-4.36 h0.64
  text "E24" at -14.679,-4.383 h0.64
  text "E30" at -14.654,-1.788 h0.64
  text "E29" at -12.088,-1.777 h0.64
  text "GND" at -12.088,0.791 h0.64
  text "REF" at -14.619,0.723 h0.64
  text "E23" at -14.665,3.312 h0.64
  text "E22" at -12.088,3.312 h0.64
  text "E20" at -12.088,5.855 h0.64
  text "E21" at -14.722,5.889 h0.64
  text "E19" at -14.767,8.398 h0.64
  text "E18" at -12.145,8.387 h0.64
  text "E16" at -12.201,10.932 h0.64
  text "E17" at -14.767,10.932 h0.64
  text "A0" at -14.776,-9.299 h0.64
  text "A1" at -11.363,-9.244 h0.64
  text "A2" at -12.19,-13.461 h0.64
  text "A3" at -12.171,-15.982 h0.64
  text "A4" at -9.566,-13.437 h0.64
  text "A5" at -9.535,-16.001 h0.64
  text "A6" at -7.162,-13.473 h0.64
  text "A7" at -7.112,-15.96 h0.64
  text "A13" at -4.56,-13.67 h0.64
  text "A12" at -4.56,-16.245 h0.64
  text "A15" at -2.02,-13.67 h0.64
  text "A14" at -2.02,-16.21 h0.64
  text "A17" at 0.52,-13.67 h0.64
  text "A16" at 0.52,-16.21 h0.64
  text "B1" at 3.049,-13.4 h0.64
  text "B0" at 3.083,-15.893 h0.64
  text "B3" at 5.582,-13.369 h0.64
  text "B2" at 5.565,-15.927 h0.64
  text "B7" at 8.127,-13.379 h0.64
  text "B8" at 8.074,-15.893 h0.64
  text "B11" at 10.574,-13.564 h0.64
  text "B9" at 10.574,-15.906 h0.64
  text "B17" at 13.194,-13.593 h0.64
  text "B10" at 13.22,-16.121 h0.64
  text "B18" at 13.249,-14.477 h0.64
  text "B16" at 13.724,-16.761 h0.5